# Altium footprint library L1.PcbLib: 21 footprints (part 1 of 2)
Each footprint in its own frame and in the unit in brackets; x right, y up, seen from the top. Pads: shape width x height; smd on the part's side, far side on the other; paste and mask are expansions set on the pad; w line width, h text height; cw(c..) or ccw(c..) is an arc to the next point about the centre after c.
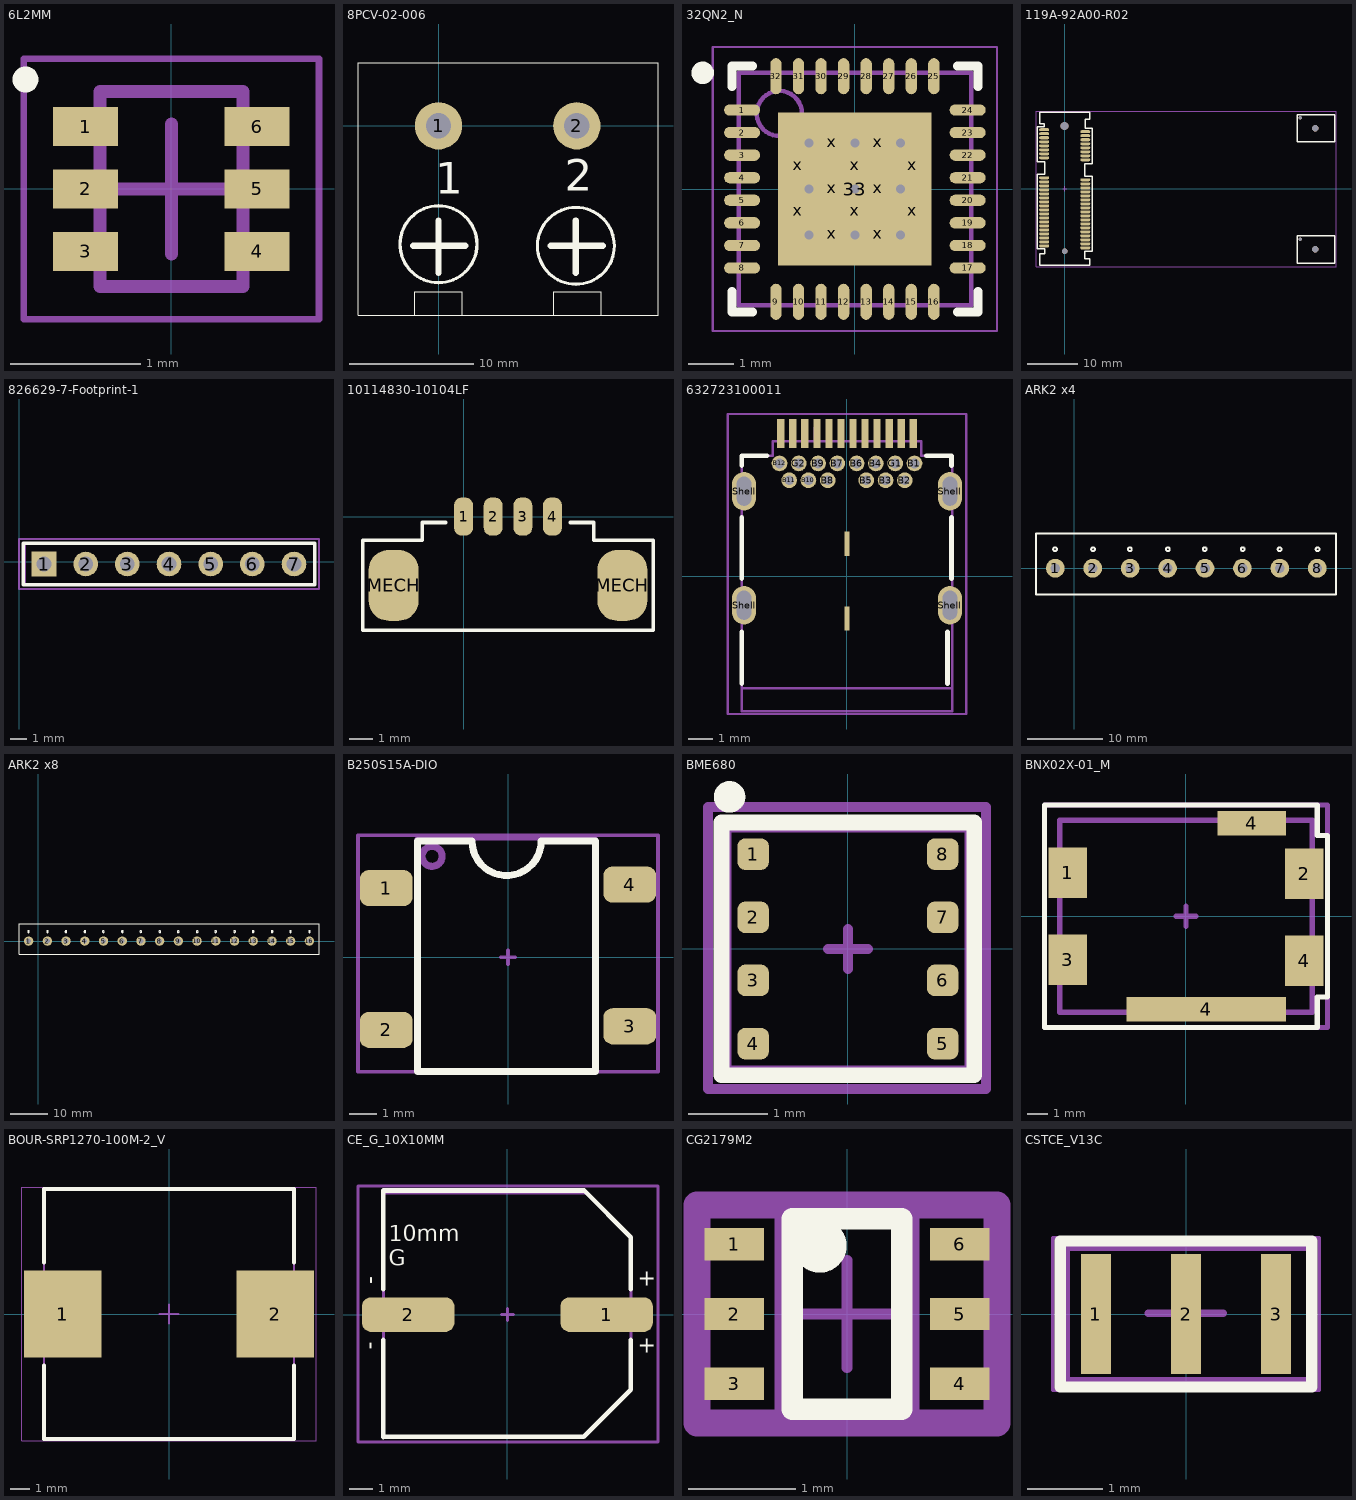
[diagram p0: the footprints below, top view; thin cyan lines are the x and y axes]

## 6L2MM [mm] "6-pin lead-less mini mold package"
height 0.55
pads (6):
  rect 0.5x0.3 smd: 1(-0.66,0.48) 2(-0.66,0) 3(-0.66,-0.48) 4(0.66,-0.48) 5(0.66,0) 6(0.66,0.48)
Top Overlay:
  circle w0.1: c-1.122,0.842 r0.05
Mechanical 13:
  lines w0.1: -0.55,-0.75 0.55,-0.75 0.55,0.75 -0.55,0.75 -0.55,-0.75
Mechanical 15:
  lines w0.05: -1.135,-1 1.135,-1 1.135,1 -1.135,1 -1.135,-1
  lines w0.1: -0.5,0 0.5,0 ; 0,-0.5 0,0.5
Mechanical 17:
  text "'.Designator'" at -0.381,1.016 h0.61
Mechanical 19:
  text "'.Comment'" at -0.381,1.016 h0.61
3D body "6L2MM.step": height 0.55, standoff 0, extent -0.65,-0.748 0.65,0.748

## 8PCV-02-006 [mil]
pads (2):
  round 150 hole 80: 1(0,0) 2(438,0)
Top Overlay:
  circle w10: c0,-375 r121.76
  circle w10: c435,-380 r121.76
  lines w3.94: -75,-600 -75,-525 75,-525 75,-600 ; 365,-600 365,-525 515,-525 515,-600 ; -255,-600 695,-600 695,200 -255,200 -255,-600
  lines w20: -80,-380 85,-380 ; 0,-465 0,-300 ; 355,-380 520,-380 ; 435,-465 435,-300
  text "2" at 400,-205 h100
  text "1" at -10,-215 h100
3D body "8pcv-02-006.stp": height 770, standoff -185, extent -254,-600 694,200

## 32QN2_N [mm]
pads (45):
  oval 0.8x0.25 smd: 1(-2.5,1.75) 2(-2.5,1.25) 3(-2.5,0.75) 4(-2.5,0.25) 5(-2.5,-0.25) 6(-2.5,-0.75) 7(-2.5,-1.25) 8(-2.5,-1.75) 17(2.5,-1.75) 18(2.5,-1.25) 19(2.5,-0.75) 20(2.5,-0.25) 21(2.5,0.25) 22(2.5,0.75) 23(2.5,1.25) 24(2.5,1.75)
  oval 0.25x0.8 smd: 9(-1.75,-2.5) 10(-1.25,-2.5) 11(-0.75,-2.5) 12(-0.25,-2.5) 13(0.25,-2.5) 14(0.75,-2.5) 15(1.25,-2.5) 16(1.75,-2.5) 25(1.75,2.5) 26(1.25,2.5) 27(0.75,2.5) 28(0.25,2.5) 29(-0.25,2.5) 30(-0.75,2.5) 31(-1.25,2.5) 32(-1.75,2.5)
  rect 3.4x3.4 smd paste-5: 33(0,0)
  rect 0.457x0.457 on Top Paste: x(-1.27,-0.508) x(-1.27,0.508) x(-0.508,-1.016) x(-0.508,0) x(-0.508,1.016) x(0,-0.508) x(0,0.508) x(0.508,-1.016) x(0.508,0) x(0.508,1.016) x(1.27,-0.508) x(1.27,0.508)
via 0,0 diameter 0.505 hole 0.2
via -1.016,0 diameter 0.505 hole 0.2
via 1.016,0 diameter 0.505 hole 0.2
via 1.016,1.016 diameter 0.505 hole 0.2
via 0,1.016 diameter 0.505 hole 0.2
via -1.016,1.016 diameter 0.505 hole 0.2
via -1.016,-1.016 diameter 0.505 hole 0.2
via 0,-1.016 diameter 0.505 hole 0.2
via 1.016,-1.016 diameter 0.505 hole 0.2
Top Overlay:
  circle w0.25: c-3.375,2.575 r0.125
  lines w0.2: -2.725,-2.275 -2.725,-2.725 -2.275,-2.725 ; -2.725,2.275 -2.725,2.725 -2.275,2.725 ; 2.275,-2.725 2.725,-2.725 2.725,-2.275 ; 2.275,2.725 2.725,2.725 2.725,2.275
Mechanical 13:
  circle w0.1: c-1.675,1.675 r0.5
  lines w0.1: -2.575,-2.575 -2.575,2.575 2.575,2.575 2.575,-2.575 -2.575,-2.575
Mechanical 15:
  lines w0.05: -3.15,-3.15 -3.15,3.15 3.15,3.15 3.15,-3.15 -3.15,-3.15
  lines w0.1: -0.5,0 0.5,0 ; 0,-0.5 0,0.5
Mechanical 17:
  text "'.Designator'" at -2.794,-0.254 h0.64
Mechanical 19:
  text "'.Comment'" at -2.794,-0.254 h0.64
3D body "User Library-qfn32-5x5.step": height 0.8, standoff 0, extent -2.51,-2.51 2.51,2.51

## 119A-92A00-R02 [mm]
pads (52):
  oval 2x0.6 smd: 1(-4.1,11.8) 2(4.1,11.4) 3(-4.1,11) 4(4.1,10.6) 5(-4.1,10.2) 6(4.1,9.8) 7(-4.1,9.4) 8(4.1,9) 9(-4.1,8.6) 10(4.1,8.2) 11(-4.1,7.8) 12(4.1,7.4) 13(-4.1,7) 14(4.1,6.6) 15(-4.1,6.2) 16(4.1,5.8) 17(-4.1,2.2) 18(4.1,1.8) 19(-4.1,1.4) 20(4.1,1) 21(-4.1,0.6) 22(4.1,0.2) 23(-4.1,-0.2) 24(4.1,-0.6) 25(-4.1,-1) 26(4.1,-1.4) 27(-4.1,-1.8) 28(4.1,-2.2) 29(-4.1,-2.6) 30(4.1,-3) 31(-4.1,-3.4) 32(4.1,-3.8) 33(-4.1,-4.2) 34(4.1,-4.6) 35(-4.1,-5) 36(4.1,-5.4) 37(-4.1,-5.8) 38(4.1,-6.2) 39(-4.1,-6.6) 40(4.1,-7) 41(-4.1,-7.4) 42(4.1,-7.8) 43(-4.1,-8.2) 44(4.1,-8.6) 45(-4.1,-9) 46(4.1,-9.4) 47(-4.1,-9.8) 48(4.1,-10.2) 49(-4.1,-10.6) 50(4.1,-11) 51(-4.1,-11.4) 52(4.1,-11.8)
via 47.05,-10.05 diameter 0.7 hole 0.7
via 47.05,14.15 diameter 0.7 hole 0.7
via 0,-12.5 diameter 1.1 hole 1.1
via 0,12.5 diameter 1.6 hole 1.6
via 50.05,12.1 diameter 1.35 hole 1.35
via 50.05,-12.1 diameter 1.35 hole 1.35
Top Overlay:
  lines w0.254: -5.5,-12 -5.5,2.87 -4,2.87 -4,5.37 -5.49,5.37 -5.49,12.42 -4.07,12.42 -4.07,12.97 -4.95,12.97 -4.95,15.25 4.95,15.25 4.95,13.93 4.07,13.93 4.07,12.05 5.5,12.05 5.5,5 4,5 4,2.5 5.5,2.5 5.5,-12.5 4,-12.5 4,-14 5,-14 5,-15.25 -4.95,-15.25 -4.95,-13 -4,-13 -4,-12 -5.5,-12 ; 46.49,-14.83 53.94,-14.83 53.94,-9.43 46.49,-9.43 46.49,-14.83 ; 46.49,9.37 46.49,14.77 53.94,14.77 53.94,9.37 46.49,9.37
Mechanical 3:
  text "ONLY LOW COMPONENTS ALLOWED HERE" at 4.5,3 h1.52
Mechanical 13:
  lines w0.2: -5.74,-15.55 -5.74,15.47 54.2,15.47 54.2,-15.55 -5.74,-15.55
Mechanical 15:
  lines w0.2: -0.4,0 0.4,0 ; 0,-0.5 0,0.5 ; -5.74,-15.55 -5.74,15.47 54.2,15.47 54.2,-15.55 -5.74,-15.55
Mechanical 17:
  text "'.Designator'" at 19.5,1.5 h1.02
Mechanical 19:
  text "'.Comment'" at 19.5,-0.5 h1.02
3D body "pcie.step": height 10.9, standoff -0.7, extent -4.737,-15.031 53.713,14.976

## 826629-7-Footprint-1 [mm]
pads (7):
  rect 1.5x1.5 hole 0.9: 1(1.524,-0.127)
  round 1.5 hole 0.9: 2(4.064,-0.127) 3(6.604,-0.127) 4(9.144,-0.127) 5(11.684,-0.127) 6(14.224,-0.127) 7(16.764,-0.127)
Top Overlay:
  lines w0.2: 0.254,-1.397 10.414,-1.397 18.034,-1.397 18.034,1.143 10.414,1.143 0.254,1.143 0.254,-1.397
Mechanical 2:
  lines w0.15: 0.354,-1.373 18.034,-1.373 18.034,1.126 0.354,1.126 0.354,-1.373
Mechanical 4:
  lines w0.1: 0,-1.651 0,1.397 10.668,1.397 18.288,1.397 18.288,-1.651 10.668,-1.651 0,-1.651
3D body "pin_header_aw140-eg-g03d.stp": height 8.2, standoff -3, extent 10.514,-1.373 18.134,1.126
3D body "pin_header_aw140-eg-g04d.stp": height 8.2, standoff -3, extent 0.354,-1.373 10.514,1.126

## 10114830-10104LF [mm]
pads (6):
  rrect80% 0.8x1.6 smd mask+0: 1(0,0) 2(1.25,0) 3(2.5,0) 4(3.75,0)
  rrect80% 2.1x3 smd mask+0: MECH(-2.95,-2.9) MECH(6.7,-2.9)
Top Overlay:
  lines w0.15: -0.75,-0.25 -1.75,-0.25 -1.75,-1 -4.25,-1 -4.25,-4.8 -3.45,-4.8 8,-4.8 8,-1 5.5,-1 5.5,-0.25 4.5,-0.25
3D body "10114830-XXX04LFc.STEP": height 3.45, standoff -0.03, extent -3.2,-4.875 6.95,0.425

## 632723100011 [mm]
pads (32):
  rect 0.3x1.2 smd: A1(-2.75,5.93) A2(-2.25,5.93) A3(-1.75,5.93) A4(-1.25,5.93) A5(-0.75,5.93) A6(-0.25,5.93) A7(0.25,5.93) A8(0.75,5.93) A9(1.25,5.93) A10(1.75,5.93) A11(2.25,5.93) A12(2.75,5.93)
  round 0.65 hole 0.4: B1(2.8,4.68) B2(2.4,3.98) B3(1.6,3.98) B4(1.2,4.68) B5(0.8,3.98) B6(0.4,4.68) B7(-0.4,4.68) B8(-0.8,3.98) B9(-1.2,4.68) B10(-1.6,3.98) B11(-2.4,3.98) B12(-2.8,4.68) G1(2,4.68) G2(-2,4.68)
  oval 1x1.6 hole 0.6 slot 1.2 at 90 deg: Shell(-4.27,-1.2) Shell(-4.27,3.53) Shell(4.27,-1.2) Shell(4.27,3.53)
  rect 0.2x1 smd: Shell(0,-1.75) Shell(0,1.35)
Top Overlay:
  lines w0.2: -4.37,-4.45 -4.37,-2.3 ; -4.37,-0.1 -4.37,2.45 ; -4.37,4.6 -4.37,5 -3.32,5 ; 3.29,5 4.34,5 4.34,4.6 ; 4.17,-4.45 4.17,-2.3 ; 4.34,-0.1 4.34,2.45
Mechanical 2:
  lines w0.1: -4.37,-4.65 4.37,-4.65
  text "PCB Edge" at -1.7,-5.6 h0.61
Mechanical 3:
  lines w0.1: -4.953,-5.715 4.953,-5.715 4.953,6.731 -4.953,6.731 -4.953,-5.715
Mechanical 5:
  lines w0.05: -2.85,5.6 -2.85,6.19 -2.65,6.19 -2.65,5.6 ; -2.35,5.6 -2.35,6.19 -2.15,6.19 -2.15,5.6 ; -1.85,5.6 -1.85,6.19 -1.65,6.19 -1.65,5.6 ; -1.35,5.6 -1.35,6.19 -1.15,6.19 -1.15,5.6 ; -0.85,5.6 -0.85,6.19 -0.65,6.19 -0.65,5.6 ; -0.35,5.6 -0.35,6.19 -0.15,6.19 -0.15,5.6 ; 0.15,5.6 0.15,6.19 0.35,6.19 0.35,5.6 ; 0.65,5.6 0.65,6.19 0.85,6.19 0.85,5.6 ; 1.15,5.6 1.15,6.19 1.35,6.19 1.35,5.6 ; 1.65,5.6 1.65,6.19 1.85,6.19 1.85,5.6 ; 2.15,5.6 2.15,6.19 2.35,6.19 2.35,5.6 ; 2.65,5.6 2.65,6.19 2.85,6.19 2.85,5.6
  lines w0.1: 4.34,-5.6 -4.37,-5.6 -4.37,5 -3.08,5 -3.08,5.6 3.08,5.6 3.08,5 4.37,5 4.37,-5.6
3D body "632723100011.stp": height 3.05, standoff -1.81, extent -4.37,-5.6 4.37,6.194

## ARK2 x4 [mm]
pads (8):
  round 2.5 hole 1.3: 1(-2.5,0) 2(2.5,0) 3(7.5,0) 4(12.5,0) 5(17.5,0) 6(22.5,0) 7(27.5,0) 8(32.5,0)
Top Overlay:
  circle w0.254: c32.54,2.54 r0.254
  circle w0.254: c27.46,2.54 r0.254
  circle w0.254: c22.54,2.54 r0.254
  circle w0.254: c17.46,2.54 r0.254
  circle w0.254: c7.46,2.54 r0.254
  circle w0.254: c12.54,2.54 r0.254
  circle w0.254: c-2.54,2.54 r0.254
  circle w0.254: c2.54,2.54 r0.254
  lines w0.254: -5.08,-3.5 35,-3.5 35,4.625 -5.08,4.625 -5.08,-3.5
3D body "User Library-TB2.STEP": height 10.1, standoff -3.4, extent 25,-3.428 35,4.572
3D body "User Library-TB2.STEP": height 10.1, standoff -3.4, extent 15,-3.428 25,4.572
3D body "User Library-TB2.STEP": height 10.1, standoff -3.4, extent 5,-3.428 15,4.572
3D body "User Library-TB2.STEP": height 10.1, standoff -3.4, extent -5,-3.428 5,4.572

## ARK2 x8 [mm]
pads (16):
  round 2.5 hole 1.3: 1(-2.5,0) 2(2.5,0) 3(7.5,0) 4(12.5,0) 5(17.5,0) 6(22.5,0) 7(27.5,0) 8(32.5,0) 9(37.5,0) 10(42.5,0) 11(47.5,0) 12(52.5,0) 13(57.5,0) 14(62.5,0) 15(67.5,0) 16(72.5,0)
Top Overlay:
  circle w0.254: c72.54,2.54 r0.254
  circle w0.254: c67.46,2.54 r0.254
  circle w0.254: c62.54,2.54 r0.254
  circle w0.254: c57.46,2.54 r0.254
  circle w0.254: c52.54,2.54 r0.254
  circle w0.254: c47.46,2.54 r0.254
  circle w0.254: c42.54,2.54 r0.254
  circle w0.254: c37.46,2.54 r0.254
  circle w0.254: c32.54,2.54 r0.254
  circle w0.254: c27.46,2.54 r0.254
  circle w0.254: c22.54,2.54 r0.254
  circle w0.254: c17.46,2.54 r0.254
  circle w0.254: c7.46,2.54 r0.254
  circle w0.254: c12.54,2.54 r0.254
  circle w0.254: c-2.54,2.54 r0.254
  circle w0.254: c2.54,2.54 r0.254
  lines w0.254: -5.08,-3.5 75.075,-3.5 75.075,4.625 -5.08,4.625 -5.08,-3.5
3D body "User Library-TB2.STEP": height 10.1, standoff -3.4, extent 65,-3.428 75,4.572
3D body "User Library-TB2.STEP": height 10.1, standoff -3.4, extent 55,-3.428 65,4.572
3D body "User Library-TB2.STEP": height 10.1, standoff -3.4, extent 45,-3.428 55,4.572
3D body "User Library-TB2.STEP": height 10.1, standoff -3.4, extent 35,-3.428 45,4.572
3D body "User Library-TB2.STEP": height 10.1, standoff -3.4, extent 25,-3.428 35,4.572
3D body "User Library-TB2.STEP": height 10.1, standoff -3.4, extent 15,-3.428 25,4.572
3D body "User Library-TB2.STEP": height 10.1, standoff -3.4, extent 5,-3.428 15,4.572
3D body "User Library-TB2.STEP": height 10.1, standoff -3.4, extent -5,-3.428 5,4.572

## B250S15A-DIO [mm] "Diode bridge SMD"
pads (4):
  rrect50% 1.9x1.3 smd: 1(-4.381,2.486) 2(-4.381,-2.613) 3(4.381,-2.486) 4(4.381,2.613)
Top Overlay:
  lines w0.254: -3.25,-4.118 3.15,-4.118 3.15,4.183 1.195,4.183 cw(c-0.05,4.183) -1.295,4.183 -3.25,4.183 -3.25,-4.118
Mechanical 13:
  circle w0.254: c-2.73,3.629 r0.359
  lines w0.127: -3.302,-4.118 3.175,-4.118 3.175,4.264 -3.302,4.264 -3.302,-4.118
Mechanical 15:
  lines w0.127: -0.254,0 0.254,0 ; 0,-0.254 0,0.254 ; -5.397,-4.118 5.397,-4.118 5.397,4.391 -5.397,4.391 -5.397,-4.118
Mechanical 17:
  text "'.Designator'" at -3.429,-3.81 h0.38
Mechanical 19:
  text "'.Comment'" at -3.429,-3.81 h0.38
3D body "User Library-SDIP-1.step": height 2.93, standoff 0, extent -4.859,-4.185 5.141,4.315

## BME680 [mm]
pads (8):
  rrect50% 0.4x0.4 smd mask+0.1: 1(-1.2,1.2) 2(-1.2,0.4) 3(-1.2,-0.4) 4(-1.2,-1.2) 5(1.2,-1.2) 6(1.2,-0.4) 7(1.2,0.4) 8(1.2,1.2)
Top Overlay:
  circle w0.2: c-1.5,1.925 r0.1
  lines w0.2: -1.6,-1.6 -1.6,1.6 1.6,1.6 1.6,-1.6 -1.6,-1.6
Mechanical 13:
  lines w0.051: -1.501,-1.501 1.499,-1.501 1.499,1.499 -1.501,1.499 -1.501,-1.501
Mechanical 15:
  lines w0.127: -0.254,0 0.254,0 ; 0,-0.254 0,0.254 ; -1.775,-1.775 1.751,-1.775 1.751,1.8 -1.775,1.8 -1.775,-1.775
Mechanical 17:
  text "'.Designator'" at -1.043,1.823 h0.2
3D body "User Library-BME680.STEP": height 0.95, standoff 0, extent -1.501,-1.501 1.499,1.499

## BNX02X-01_M [mm]
pads (6):
  rect 1.9x2.5 smd: 1(-5.85,2.15) 2(5.85,2.1) 3(-5.85,-2.15) 4(5.85,-2.2)
  rect 7.9x1.2 smd: 4(1,-4.6)
  rect 3.4x1.2 smd: 4(3.25,4.6)
Top Overlay:
  lines w0.254: -7,-5.5 -7,-4 -7,1 -7,4 -7,5.5 1,5.5 5.5,5.5 6.5,5.5 6.5,4 7,4 7,-4 6.5,-4 6.5,-5.5 -3.5,-5.5 -7,-5.5
Mechanical 13:
  lines w0.254: -6.25,-4.75 6.25,-4.75 6.25,4.75 -6.25,4.75 -6.25,-4.75
Mechanical 15:
  lines w0.254: -0.5,0 0.5,0 ; 0,-0.5 0,0.5 ; -7,-5.5 -7,-0.75 -7,0.75 -7,5.5 7,5.5 7,-5.5 -7,-5.5
Mechanical 17:
  text "'.Designator'" at -6.5,-1.25 h1.52
Mechanical 19:
  text "'.Comment'" at -6.5,-1.25 h1.52
3D body "User Library-BNX022.step": height 3.1, standoff 0, extent -6.05,-4.55 6.05,4.55

## BOUR-SRP1270-100M-2_V [mm] "SMD, 2-Leads, Body 12.9x12.9mm"
height 7
pads (2):
  rect 4x4.5 smd: 1(-5.5,0) 2(5.5,0)
Top Overlay:
  lines w0.2: -6.45,-2.65 -6.45,-6.45 6.45,-6.45 6.45,-2.65 ; -6.45,2.65 -6.45,6.45 6.45,6.45 6.45,2.65
Mechanical 13:
  lines w0.1: -6.45,-6.45 -6.45,6.45 6.45,6.45 6.45,-6.45 -6.45,-6.45
Mechanical 15:
  lines w0.05: -7.6,-6.55 7.6,-6.55 7.6,6.55 -7.6,6.55 -7.6,-6.55
  lines w0.1: -0.5,0 0.5,0 ; 0,-0.5 0,0.5
3D body: height 7, standoff 0, extent -6.45,-6.45 6.45,6.45

## CE_G_10X10MM [mm] "Electrolytic Capacitor 10mm Diamater"
height 10
pads (2):
  rrect50% 4x1.5 smd: 1(4.3,0) 2(-4.3,0)
Top Overlay:
  lines w0.2: -5.378,-1.1 -5.384,-5.304 3.302,-5.298 5.35,-3.25 5.35,-1.1 ; -5.375,1.1 -5.375,5.375 3.325,5.375 5.35,3.35 5.35,1.1
  text "-" at -5.66,-1.53 h0.7
  text "-" at -5.65,1.32 h0.7
  text "+" at 5.655,-1.66 h0.7
  text "+" at 5.655,1.25 h0.7
  text "10mm / G" at -5.15,2.125 h0.7
Mechanical 2:
  lines w0.127: -5.378,-5.304 -5.378,5.275 3.45,5.275 5.35,3.375 5.35,-3.25 3.296,-5.304 -5.378,-5.304
Mechanical 4:
  lines w0.127: -0.254,0 0.254,0 ; 0,-0.254 0,0.254 ; -6.475,-5.525 -6.475,5.575 6.525,5.575 6.525,-5.525 -6.475,-5.525
3D body "User Library-ALU-G13.step": height 14, standoff 0, extent -6.15,-5.25 6.15,5.25

## CG2179M2 [mm] "6pin 1.25x2 package"
pads (6):
  rect 0.55x0.3 smd: 1(-1.05,0.65) 2(-1.05,0) 3(-1.05,-0.65) 4(1.05,-0.65) 5(1.05,0) 6(1.05,0.65)
Top Overlay:
  circle w0.25: c-0.254,0.635 r0.125
  lines w0.2: -0.508,-0.889 -0.508,0.889 0.508,0.889 0.508,-0.889 -0.508,-0.889
Mechanical 13:
  lines w0.1: -0.625,-1 0.625,-1 0.625,1 -0.625,1 -0.625,-1
Mechanical 15:
  lines w0.1: -0.5,0 0.5,0 ; 0,-0.5 0,0.5
  lines w0.254: -1.397,-1.016 -1.397,1.016 1.397,1.016 1.397,-1.016 -1.397,-1.016
Mechanical 17:
  text "'.Designator'" at -1.397,-0.025 h0.25
Mechanical 19:
  text "'.Comment'" at -1.143,-0.051 h0.25
3D body: height 0.9, standoff 0, extent -0.686,-1.041 0.66,1.016

## CSTCE_V13C [mm]
height 1.3
pads (3):
  rect 0.4x1.6 smd: 1(-1.2,0) 2(0,0) 3(1.2,0)
Top Overlay:
  lines w0.15: -1.675,-0.975 1.675,-0.975 1.675,0.975 -1.675,0.975 -1.675,-0.975
Mechanical 13:
  lines w0.1: -1.6,-0.889 -1.6,0.889 1.651,0.889 1.651,-0.889 -1.6,-0.889
Mechanical 15:
  lines w0.05: -1.778,-1.016 -1.778,1.016 1.778,1.016 1.778,-1.016 -1.778,-1.016
  lines w0.1: -0.501,0.008 0.499,0.008 ; -0.001,-0.492 -0.001,0.508
Mechanical 17:
  text "'.Designator'" at -1.675,-0.125 h0.3
3D body "User Library-CSTCE.step": height 0.7, standoff 0, extent -1.6,-0.65 1.6,0.65